# Altium footprint library WR-TBL_Pluggable PCB Header.PcbLib: 719 footprints (part 23 of 45)
Each footprint in its own frame and in the unit in brackets; x right, y up, seen from the top. Pads: shape width x height; smd on the part's side, far side on the other; paste and mask are expansions set on the pad; w line width, h text height; cw(c..) or ccw(c..) is an arc to the next point about the centre after c.
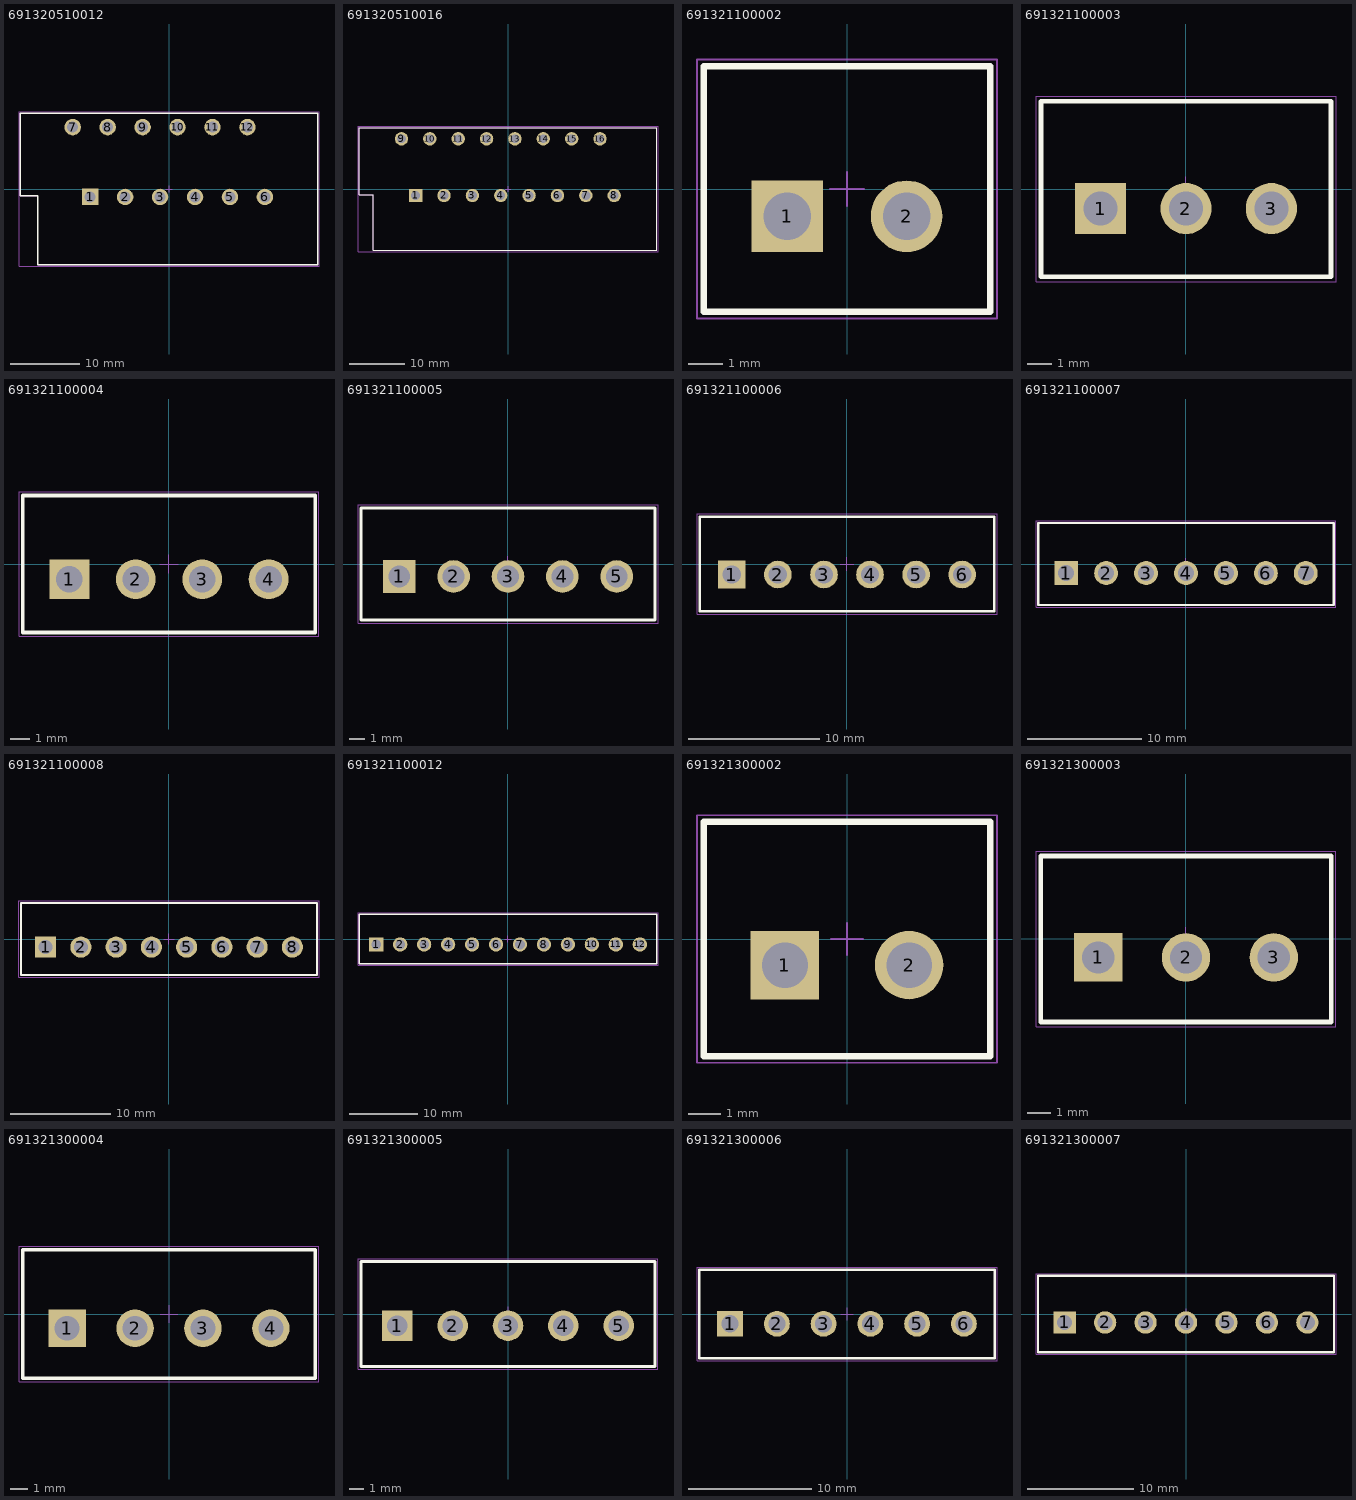
[diagram p22: the footprints below, top view; thin cyan lines are the x and y axes]

## 691320510012 [mm] "Double Level Horizontal Male PCB Header with closed Flanges & Nut Type, pitch 5.08mm, 12p"
height 23.7
pads (12):
  rect 2.4x2.4 hole 1.6: 1(-11.46,-1.16)
  round 2.4 hole 1.6: 2(-6.38,-1.16) 3(-1.3,-1.16) 4(3.78,-1.16) 5(8.86,-1.16) 6(13.94,-1.16) 7(-14,9) 8(-8.92,9) 9(-3.84,9) 10(1.24,9) 11(6.32,9) 12(11.4,9)
Top Overlay:
  lines w0.2: -21.6,-1 -19.06,-1 -19.06,-11 21.6,-11 21.6,11 -21.6,11 -21.6,-1
Mechanical 13:
  lines w0.1: -21.6,-1 -21.6,11 21.6,11 21.6,-11 -19.06,-11 -19.06,-1 -21.6,-1
Mechanical 15:
  lines w0.05: -0.5,0 0.5,0 ; 0,-0.5 0,0.5 ; -21.8,-11.2 21.8,-11.2 21.8,11.2 -21.8,11.2 -21.8,-11.2
3D body "691320510012.stp": height 23.74, standoff -3.96, extent -21.59,-11 21.59,11

## 691320510016 [mm] "Double Level Horizontal Male PCB Header with closed Flanges & Nut Type, pitch 5.08mm, 16p"
height 23.7
pads (16):
  rect 2.4x2.4 hole 1.6: 1(-16.54,-1.16)
  round 2.4 hole 1.6: 2(-11.46,-1.16) 3(-6.38,-1.16) 4(-1.3,-1.16) 5(3.78,-1.16) 6(8.86,-1.16) 7(13.94,-1.16) 8(19.02,-1.16) 9(-19.08,9) 10(-14,9) 11(-8.92,9) 12(-3.84,9) 13(1.24,9) 14(6.32,9) 15(11.4,9) 16(16.48,9)
Top Overlay:
  lines w0.2: -26.68,-1 -26.68,11 26.68,11 26.68,-11 -24.14,-11 -24.14,-1 -26.68,-1
Mechanical 13:
  lines w0.1: -26.68,-1 -24.14,-1 -24.14,-11 26.68,-11 26.68,11 -26.68,11 -26.68,-1
Mechanical 15:
  lines w0.05: -0.5,0 0.5,0 ; 0,-0.5 0,0.5 ; -26.88,-11.2 -26.88,11.2 26.88,11.2 26.88,-11.2 -26.88,-11.2
3D body "691320510016.stp": height 23.74, standoff -3.96, extent -26.67,-11 26.67,11

## 691321100002 [mm] "Vertical PCB Header, pitch 3.5mm, 02p"
height 9.2
pads (2):
  rect 2.1x2.1 hole 1.4: 1(-1.75,-0.8)
  round 2.1 hole 1.4: 2(1.75,-0.8)
Top Overlay:
  lines w0.2: -4.2,-3.6 -4.2,3.6 4.2,3.6 4.2,-3.6 -4.2,-3.6
Mechanical 13:
  lines w0.1: -4.2,-3.6 4.2,-3.6 4.2,3.6 -4.2,3.6 -4.2,-3.6
Mechanical 15:
  lines w0.05: -0.5,0 0.5,0 ; 0,-0.5 0,0.5 ; -4.4,-3.8 -4.4,3.8 4.4,3.8 4.4,-3.8 -4.4,-3.8
3D body "691321100002.stp": height 9.3, standoff -3.4, extent -4.2,-3.6 4.2,3.6

## 691321100003 [mm] "Vertical PCB Header, pitch 3.5mm, 03p"
height 9.2
pads (3):
  rect 2.1x2.1 hole 1.4: 1(-3.5,-0.8)
  round 2.1 hole 1.4: 2(0,-0.8) 3(3.5,-0.8)
Top Overlay:
  lines w0.2: -5.95,-3.6 5.95,-3.6 5.95,3.6 -5.95,3.6 -5.95,-3.6
Mechanical 13:
  lines w0.1: -5.95,-3.6 -5.95,3.6 5.95,3.6 5.95,-3.6 -5.95,-3.6
Mechanical 15:
  lines w0.05: -0.5,0 0.5,0 ; 0,-0.5 0,0.5 ; -6.15,-3.8 6.15,-3.8 6.15,3.8 -6.15,3.8 -6.15,-3.8
3D body "691321100003.stp": height 9.3, standoff -3.4, extent -5.95,-3.6 5.95,3.6

## 691321100004 [mm] "Vertical PCB Header, pitch 3.5mm, 04p"
height 9.2
pads (4):
  rect 2.1x2.1 hole 1.4: 1(-5.25,-0.8)
  round 2.1 hole 1.4: 2(-1.75,-0.8) 3(1.75,-0.8) 4(5.25,-0.8)
Top Overlay:
  lines w0.2: -7.7,-3.6 -7.7,3.6 7.7,3.6 7.7,-3.6 -7.7,-3.6
Mechanical 13:
  lines w0.1: -7.7,-3.6 7.7,-3.6 7.7,3.6 -7.7,3.6 -7.7,-3.6
Mechanical 15:
  lines w0.05: -0.5,0 0.5,0 ; 0,-0.5 0,0.5 ; -7.9,-3.8 -7.9,3.8 7.9,3.8 7.9,-3.8 -7.9,-3.8
3D body "691321100004.stp": height 9.3, standoff -3.4, extent -7.7,-3.6 7.7,3.6

## 691321100005 [mm] "Vertical PCB Header, pitch 3.5mm, 05p"
height 9.2
pads (5):
  rect 2.1x2.1 hole 1.4: 1(-7,-0.8)
  round 2.1 hole 1.4: 2(-3.5,-0.8) 3(0,-0.8) 4(3.5,-0.8) 5(7,-0.8)
Top Overlay:
  lines w0.2: -9.45,-3.6 -9.45,3.6 9.45,3.6 9.45,-3.6 -9.45,-3.6
Mechanical 13:
  lines w0.1: -9.45,-3.6 9.45,-3.6 9.45,3.6 -9.45,3.6 -9.45,-3.6
Mechanical 15:
  lines w0.05: -0.5,0 0.5,0 ; 0,-0.5 0,0.5 ; -9.65,-3.8 -9.65,3.8 9.65,3.8 9.65,-3.8 -9.65,-3.8
3D body "691321100005.stp": height 9.3, standoff -3.4, extent -9.45,-3.6 9.45,3.6

## 691321100006 [mm] "Vertical PCB Header, pitch 3.5mm, 06p"
height 9.2
pads (6):
  rect 2.1x2.1 hole 1.4: 1(-8.75,-0.8)
  round 2.1 hole 1.4: 2(-5.25,-0.8) 3(-1.75,-0.8) 4(1.75,-0.8) 5(5.25,-0.8) 6(8.75,-0.8)
Top Overlay:
  lines w0.2: -11.2,-3.6 -11.2,3.6 11.2,3.6 11.2,-3.6 -11.2,-3.6
Mechanical 13:
  lines w0.1: -11.2,-3.6 11.2,-3.6 11.2,3.6 -11.2,3.6 -11.2,-3.6
Mechanical 15:
  lines w0.05: -0.5,0 0.5,0 ; 0,-0.5 0,0.5 ; -11.4,-3.8 -11.4,3.8 11.4,3.8 11.4,-3.8 -11.4,-3.8
3D body "691321100006.stp": height 9.3, standoff -3.4, extent -11.2,-3.6 11.2,3.6

## 691321100007 [mm] "Vertical PCB Header, pitch 3.5mm, 07p"
height 9.2
pads (7):
  rect 2.1x2.1 hole 1.4: 1(-10.5,-0.8)
  round 2.1 hole 1.4: 2(-7,-0.8) 3(-3.5,-0.8) 4(0,-0.8) 5(3.5,-0.8) 6(7,-0.8) 7(10.5,-0.8)
Top Overlay:
  lines w0.2: -12.95,-3.6 -12.95,3.6 12.95,3.6 12.95,-3.6 -12.95,-3.6
Mechanical 13:
  lines w0.1: -12.95,-3.6 12.95,-3.6 12.95,3.6 -12.95,3.6 -12.95,-3.6
Mechanical 15:
  lines w0.05: -0.5,0 0.5,0 ; 0,-0.5 0,0.5 ; -13.15,-3.8 -13.15,3.8 13.15,3.8 13.15,-3.8 -13.15,-3.8
3D body "691321100007.stp": height 9.3, standoff -3.4, extent -12.95,-3.6 12.95,3.6

## 691321100008 [mm] "Vertical PCB Header, pitch 3.5mm, 08p"
height 9.2
pads (8):
  rect 2.1x2.1 hole 1.4: 1(-12.25,-0.8)
  round 2.1 hole 1.4: 2(-8.75,-0.8) 3(-5.25,-0.8) 4(-1.75,-0.8) 5(1.75,-0.8) 6(5.25,-0.8) 7(8.75,-0.8) 8(12.25,-0.8)
Top Overlay:
  lines w0.2: -14.7,-3.6 -14.7,3.6 14.7,3.6 14.7,-3.6 -14.7,-3.6
Mechanical 13:
  lines w0.1: -14.7,-3.6 14.7,-3.6 14.7,3.6 -14.7,3.6 -14.7,-3.6
Mechanical 15:
  lines w0.05: -0.5,0 0.5,0 ; 0,-0.5 0,0.5 ; -14.9,-3.8 -14.9,3.8 14.9,3.8 14.9,-3.8 -14.9,-3.8
3D body "691321100008.stp": height 9.3, standoff -3.4, extent -14.7,-3.6 14.7,3.6

## 691321100012 [mm] "Vertical PCB Header, pitch 3.5mm, 12p"
height 9.2
pads (12):
  rect 2.1x2.1 hole 1.4: 1(-19.25,-0.8)
  round 2.1 hole 1.4: 2(-15.75,-0.8) 3(-12.25,-0.8) 4(-8.75,-0.8) 5(-5.25,-0.8) 6(-1.75,-0.8) 7(1.75,-0.8) 8(5.25,-0.8) 9(8.75,-0.8) 10(12.25,-0.8) 11(15.75,-0.8) 12(19.25,-0.8)
Top Overlay:
  lines w0.2: -21.7,-3.6 -21.7,3.6 21.7,3.6 21.7,-3.6 -21.7,-3.6
Mechanical 13:
  lines w0.1: -21.7,-3.6 21.7,-3.6 21.7,3.6 -21.7,3.6 -21.7,-3.6
Mechanical 15:
  lines w0.05: -0.5,0 0.5,0 ; 0,-0.5 0,0.5 ; -21.9,-3.8 -21.9,3.8 21.9,3.8 21.9,-3.8 -21.9,-3.8
3D body "691321100012.stp": height 9.3, standoff -3.4, extent -21.7,-3.6 21.7,3.6

## 691321300002 [mm] "Vertical PCB Header, pitch 3.81mm, 02p"
height 9.2
pads (2):
  rect 2.1x2.1 hole 1.4: 1(-1.905,-0.8)
  round 2.1 hole 1.4: 2(1.905,-0.8)
Top Overlay:
  lines w0.2: -4.405,-3.6 4.405,-3.6 4.405,3.6 -4.405,3.6 -4.405,-3.6
Mechanical 13:
  lines w0.1: -4.405,-3.6 -4.405,3.6 4.405,3.6 4.405,-3.6 -4.405,-3.6
Mechanical 15:
  lines w0.05: -0.5,0 0.5,0 ; 0,-0.5 0,0.5 ; -4.605,-3.8 -4.605,3.8 4.605,3.8 4.605,-3.8 -4.605,-3.8
3D body "691321300002.stp": height 9.25, standoff -3.45, extent -4.405,-3.6 4.405,3.6

## 691321300003 [mm] "Vertical PCB Header, pitch 3.81mm, 03p"
height 9.2
pads (3):
  rect 2.1x2.1 hole 1.4: 1(-3.81,-0.8)
  round 2.1 hole 1.4: 2(0,-0.8) 3(3.81,-0.8)
Top Overlay:
  lines w0.2: -6.31,-3.6 6.31,-3.6 6.31,3.6 -6.31,3.6 -6.31,-3.6
Mechanical 13:
  lines w0.1: -6.31,-3.6 -6.31,3.6 6.31,3.6 6.31,-3.6 -6.31,-3.6
Mechanical 15:
  lines w0.05: -0.5,0 0.5,0 ; 0,-0.5 0,0.5 ; -6.51,-3.8 -6.51,3.8 6.51,3.8 6.51,-3.8 -6.51,-3.8
3D body "691321300003.stp": height 9.25, standoff -3.45, extent -6.31,-3.6 6.31,3.6

## 691321300004 [mm] "Vertical PCB Header, pitch 3.81mm, 04p"
height 9.2
pads (4):
  rect 2.1x2.1 hole 1.4: 1(-5.715,-0.8)
  round 2.1 hole 1.4: 2(-1.905,-0.8) 3(1.905,-0.8) 4(5.715,-0.8)
Top Overlay:
  lines w0.2: -8.215,-3.6 8.215,-3.6 8.215,3.6 -8.215,3.6 -8.215,-3.6
Mechanical 13:
  lines w0.1: -8.215,-3.6 -8.215,3.6 8.215,3.6 8.215,-3.6 -8.215,-3.6
Mechanical 15:
  lines w0.05: -0.5,0 0.5,0 ; 0,-0.5 0,0.5 ; -8.415,-3.8 -8.415,3.8 8.415,3.8 8.415,-3.8 -8.415,-3.8
3D body "691321300004.stp": height 9.25, standoff -3.45, extent -8.215,-3.6 8.215,3.6

## 691321300005 [mm] "Vertical PCB Header, pitch 3.81mm, 05p"
height 9.2
pads (5):
  rect 2.1x2.1 hole 1.4: 1(-7.62,-0.8)
  round 2.1 hole 1.4: 2(-3.81,-0.8) 3(0,-0.8) 4(3.81,-0.8) 5(7.62,-0.8)
Top Overlay:
  lines w0.2: -10.12,-3.6 10.12,-3.6 10.12,3.6 -10.12,3.6 -10.12,-3.6
Mechanical 13:
  lines w0.1: -10.12,-3.6 -10.12,3.6 10.12,3.6 10.12,-3.6 -10.12,-3.6
Mechanical 15:
  lines w0.05: -0.5,0 0.5,0 ; 0,-0.5 0,0.5 ; -10.32,-3.8 -10.32,3.8 10.32,3.8 10.32,-3.8 -10.32,-3.8
3D body "691321300005.stp": height 9.25, standoff -3.45, extent -10.12,-3.6 10.12,3.6

## 691321300006 [mm] "Vertical PCB Header, pitch 3.81mm, 06p"
height 9.2
pads (6):
  rect 2.1x2.1 hole 1.4: 1(-9.525,-0.8)
  round 2.1 hole 1.4: 2(-5.715,-0.8) 3(-1.905,-0.8) 4(1.905,-0.8) 5(5.715,-0.8) 6(9.525,-0.8)
Top Overlay:
  lines w0.2: -12.025,-3.6 -12.025,3.6 12.025,3.6 12.025,-3.6 -12.025,-3.6
Mechanical 13:
  lines w0.1: -12.025,-3.6 12.025,-3.6 12.025,3.6 -12.025,3.6 -12.025,-3.6
Mechanical 15:
  lines w0.05: -0.5,0 0.5,0 ; 0,-0.5 0,0.5 ; -12.225,-3.8 12.225,-3.8 12.225,3.8 -12.225,3.8 -12.225,-3.8
3D body "691321300006.stp": height 9.25, standoff -3.45, extent -12.025,-3.6 12.025,3.6

## 691321300007 [mm] "Vertical PCB Header, pitch 3.81mm, 07p"
height 9.2
pads (7):
  rect 2.1x2.1 hole 1.4: 1(-11.43,-0.8)
  round 2.1 hole 1.4: 2(-7.62,-0.8) 3(-3.81,-0.8) 4(0,-0.8) 5(3.81,-0.8) 6(7.62,-0.8) 7(11.43,-0.8)
Top Overlay:
  lines w0.2: -13.93,-3.6 13.93,-3.6 13.93,3.6 -13.93,3.6 -13.93,-3.6
Mechanical 13:
  lines w0.1: -13.93,-3.6 -13.93,3.6 13.93,3.6 13.93,-3.6 -13.93,-3.6
Mechanical 15:
  lines w0.05: -0.5,0 0.5,0 ; 0,-0.5 0,0.5 ; -14.13,-3.8 -14.13,3.8 14.13,3.8 14.13,-3.8 -14.13,-3.8
3D body "691321300007.stp": height 9.25, standoff -3.45, extent -13.93,-3.6 13.93,3.6